# Altium footprint library vertigo.PcbLib: 115 footprints (part 6 of 8)
Each footprint in its own frame and in the unit in brackets; x right, y up, seen from the top. Pads: shape width x height; smd on the part's side, far side on the other; paste and mask are expansions set on the pad; w line width, h text height; cw(c..) or ccw(c..) is an arc to the next point about the centre after c.
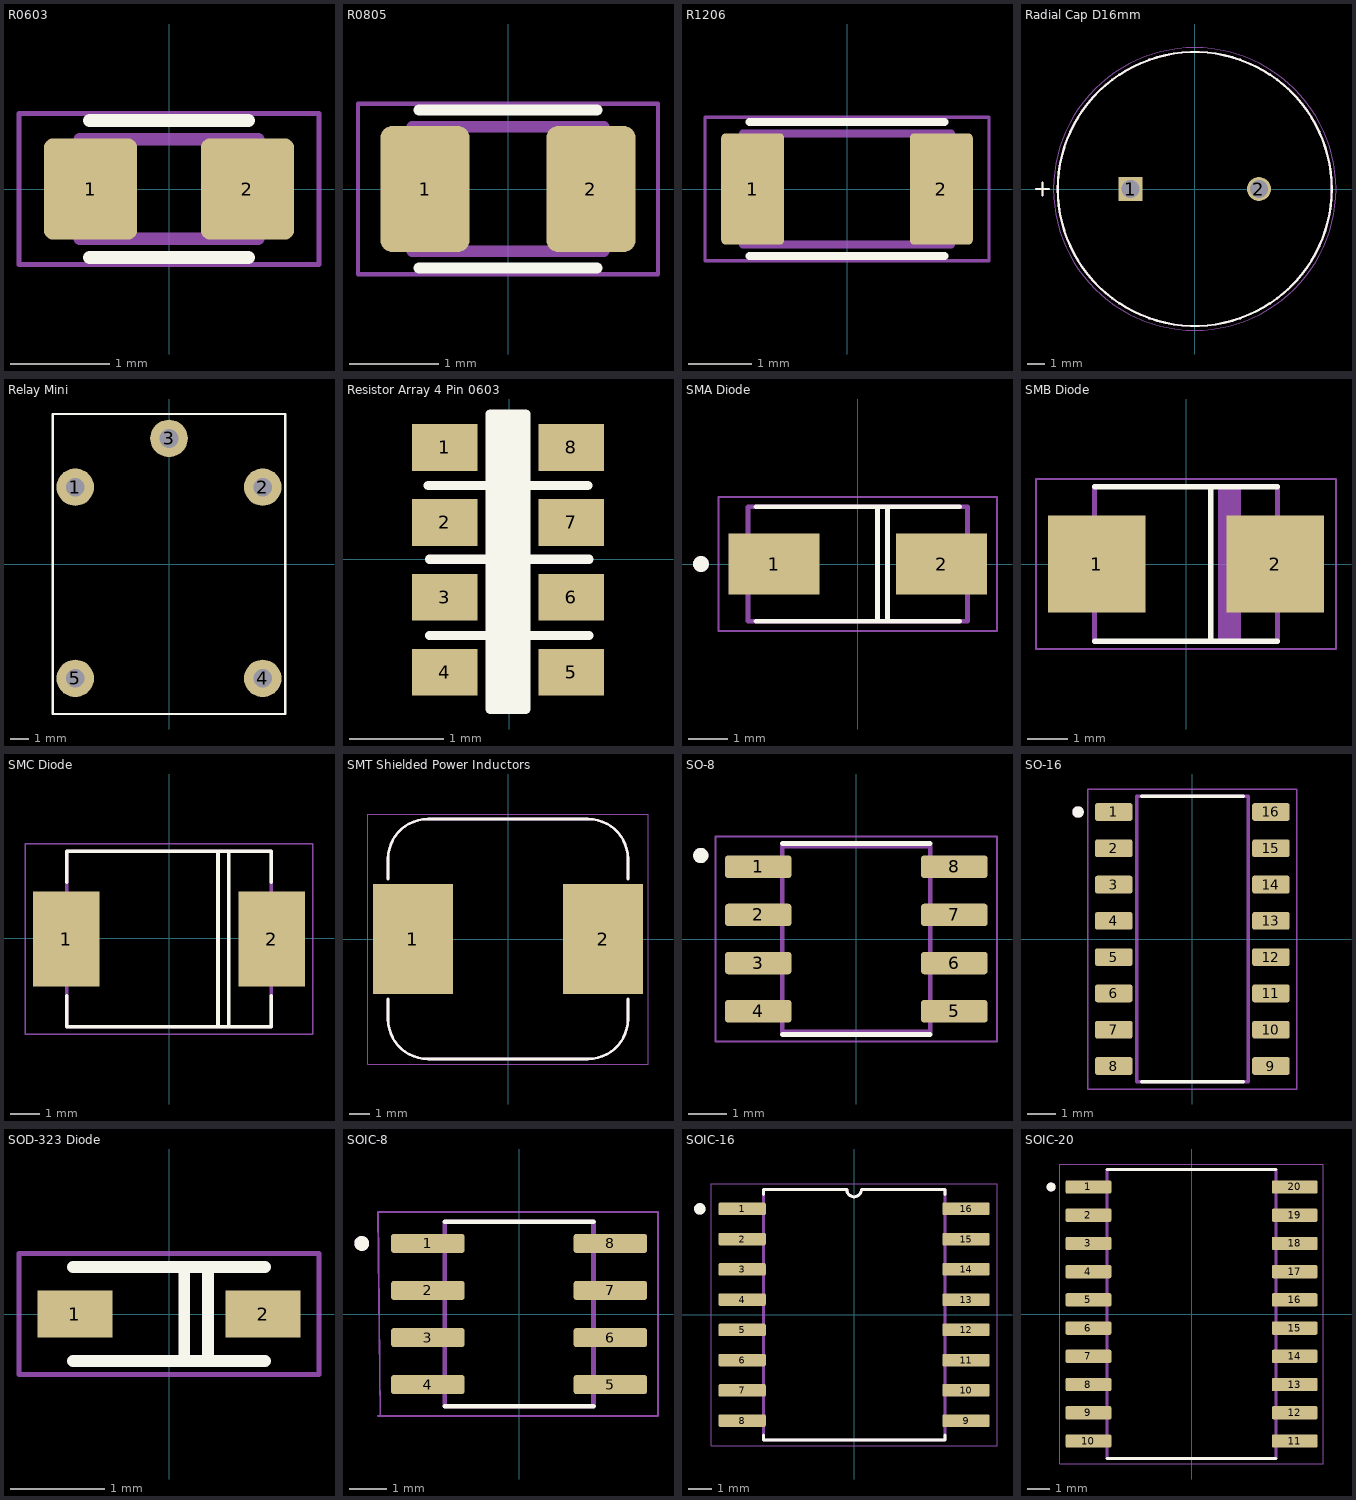
[diagram p5: the footprints below, top view; thin cyan lines are the x and y axes]

## R0603 [mm] "0603 SMD Package"
pads (2):
  rrect20% 0.94x1.02 smd: 1(-0.79,0) 2(0.79,0)
Top Overlay:
  lines w0.127: -0.8,-0.69 0.8,-0.69 ; -0.8,0.69 0.8,0.69
Mechanical 13:
  lines w0.127: -0.9,-0.5 0.9,-0.5 0.9,0.5 -0.9,0.5 -0.9,-0.5
Mechanical 15:
  lines w0.05: -1.51,-0.76 1.51,-0.76 1.51,0.76 -1.51,0.76 -1.51,-0.76
3D body "ERJU03J511V.STEP": height 0.45, standoff 0, extent -0.8,-0.4 0.8,0.4

## R0805 [mm] "0805 SMD Package"
pads (2):
  rrect25% 1x1.42 smd: 1(-0.935,0) 2(0.935,0)
Top Overlay:
  lines w0.127: -1,-0.89 1,-0.89 ; -1,0.89 1,0.89
Mechanical 13:
  lines w0.127: -1.08,-0.7 -1.08,0.7 1.08,0.7 1.08,-0.7 -1.08,-0.7
Mechanical 15:
  lines w0.05: -1.69,-0.96 -1.69,0.96 1.69,0.96 1.69,-0.96 -1.69,-0.96
3D body "4-1879028-2.STEP": height 0.6, standoff 0, extent -1,-0.625 1,0.625

## R1206 [mm] "Resistor 1206 Package"
pads (2):
  rrect14% 1x1.77 smd: 1(-1.5,0) 2(1.5,0)
Top Overlay:
  lines w0.127: -1.55,-1.065 1.55,-1.065 ; -1.55,1.065 1.55,1.065
Mechanical 13:
  lines w0.127: -1.65,-0.88 -1.65,0.88 1.65,0.88 1.65,-0.88 -1.65,-0.88
Mechanical 15:
  lines w0.05: -2.26,-1.14 -2.26,1.14 2.26,1.14 2.26,-1.14 -2.26,-1.14
3D body "R1206.STEP": height 0.55, standoff 0, extent -1.55,-0.775 1.55,0.775

## Radial Cap D16mm [mm] "Radial Package Diameter 16mm"
pads (2):
  rect 1.4x1.4 hole 1.05: 1(-3.75,0)
  round 1.4 hole 1.05: 2(3.75,0)
Top Overlay:
  circle w0.127: c0,0 r8
  lines w0.127: -9.271,0 -8.509,0 ; -8.89,-0.381 -8.89,0.381
Mechanical 13:
  circle w0.127: c0,0 r8
  lines w0.127: -9.271,0 -8.509,0 ; -8.89,-0.381 -8.89,0.381
Mechanical 15:
  circle w0.05: c0,0 r8.25
3D body "step_temp.STEP": height 25, standoff -17, extent -8,-7.997 8,7.997

## Relay Mini [mm]
pads (5):
  round 2 hole 1: 1(-5,4.1) 2(5,4.1) 3(0,6.7) 4(5,-6.1) 5(-5,-6.1)
Top Overlay:
  lines w0.127: -6.2,-8 6.2,-8 6.2,8 -6.2,8 -6.2,-8
3D body: height 14, standoff 0, extent -6.223,-8.001 6.223,8.001

## Resistor Array 4 Pin 0603 [mm]
pads (8):
  rect 0.7x0.5 smd: 1(-0.686,1.194) 2(-0.686,0.394) 3(-0.686,-0.406) 4(-0.686,-1.206) 5(0.66,-1.206) 6(0.66,-0.406) 7(0.66,0.394) 8(0.66,1.194)
Top Overlay:
  rectangle: -0.203,-1.651 0.178,1.549
  lines w0.099: -0.864,0.787 0.838,0.787 ; -0.851,-0.813 0.851,-0.813 ; -0.851,0 0.851,0 ; -0.203,-1.6 -0.203,1.549 0.178,1.549 0.178,-1.6 -0.203,-1.6
3D body "CAT16-x4.stp": height 0.6, standoff 0, extent -0.886,-1.675 0.864,1.675

## SMA Diode [mm] "DO214AC [SMA] Package"
pads (2):
  rect 2.33x1.55 smd: 1(-2.135,0) 2(2.135,0)
Top Overlay:
  circle w0.2: c-4,0 r0.1
  lines w0.127: -2.6,-1.46 2.6,-1.46 ; -2.6,1.46 2.6,1.46 ; 0.508,-1.397 0.508,1.397 ; 0.762,-1.397 0.762,1.397
Mechanical 13:
  circle w0.2: c-4,0 r0.1
  lines w0.127: 0.508,-1.397 0.508,1.397 ; 0.762,-1.397 0.762,1.397 ; -2.8,-1.46 2.8,-1.46 2.8,1.46 -2.8,1.46 -2.8,-1.46
Mechanical 15:
  lines w0.05: -3.55,-1.71 3.55,-1.71 3.55,1.71 -3.55,1.71 -3.55,-1.71
3D body "b340a-13-f.stp": height 2.18, standoff 0, extent -2.598,-1.335 2.598,1.27

## SMB Diode [mm] "DO214AA [SMB] Package"
pads (2):
  rect 2.4x2.4 smd: 1(-2.2,0) 2(2.2,0)
Top Overlay:
  lines w0.127: -2.261,-1.905 2.261,-1.905 ; -2.261,1.905 2.261,1.905 ; 0.609,-1.906 0.609,1.904
Mechanical 13:
  region: 0.8,1.9 1.35,1.9 1.35,-1.9 0.8,-1.9
  region: -2.794,1.092 -2.261,1.092 -2.261,-1.092 -2.794,-1.092
  region: 2.261,1.092 2.794,1.092 2.794,-1.092 2.261,-1.092
  lines w0.127: -2.261,-1.905 -2.261,1.905 ; 2.261,-1.905 2.261,1.905
Mechanical 15:
  lines w0.05: -3.7,-2.1 -3.7,2.1 3.7,2.1 3.7,-2.1 -3.7,-2.1
3D body "B340LB-13-F.STEP": height 2.5, standoff 0, extent -2.648,-1.81 2.648,1.81

## SMC Diode [mm] "DO214AB [SMC] Package"
pads (2):
  rect 2.25x3.18 smd: 1(-3.457,-0.033) 2(3.453,-0.033)
Top Overlay:
  lines w0.127: -3.44,-1.943 -3.44,-2.983 3.435,-2.983 3.435,-1.943 ; -3.44,1.877 -3.44,2.917 3.435,2.917 3.435,1.877 ; 1.649,-2.945 1.649,2.888 ; 2.009,-2.945 2.009,2.888
Mechanical 13:
  lines w0.127: -3.44,-2.983 -3.44,2.917 3.435,2.917 3.435,-2.983 -3.44,-2.983
Mechanical 15:
  lines w0.05: -4.832,-3.233 -4.832,3.167 4.828,3.167 4.828,-3.233 -4.832,-3.233
3D body "SS34.STEP": height 2.5, standoff 0, extent -3.95,-2.9 3.95,2.9

## SMT Shielded Power Inductors [mm] "SMT"
pads (2):
  rect 4x5.5 smd: 1(-4.75,0) 2(4.75,0)
Top Overlay:
  lines w0.127: -6,-3 -6,-4 ccw(c-4,-4) -4,-6 4,-6 ccw(c4,-4) 6,-4 6,-3 ; -6,3 -6,4 cw(c-4,4) -4,6 4,6 cw(c4,4) 6,4 6,3
Mechanical 13:
  lines w0.127: -6,-3 -6,-4 ccw(c-4,-4) -4,-6 4,-6 ccw(c4,-4) 6,-4 6,-3 ; -6,3 -6,4 cw(c-4,4) -4,6 4,6 cw(c4,4) 6,4 6,3
Mechanical 15:
  lines w0.05: -7,-6.25 7,-6.25 7,6.25 -7,6.25 -7,-6.25
3D body "MSS1246-474KLB--3DModel-STEP-56544.STEP": height 4.8, standoff 0, extent -6,-6 6,6

## SO-8 [mm] "SO-8 Package"
pads (8):
  rrect25% 1.75x0.59 smd: 1(-2.585,1.905) 2(-2.585,0.635) 3(-2.585,-0.635) 4(-2.585,-1.905) 5(2.585,-1.905) 6(2.585,-0.635) 7(2.585,0.635) 8(2.585,1.905)
Top Overlay:
  circle w0.2: c-4.1,2.2 r0.1
  lines w0.127: -1.95,-2.52 1.95,-2.52 ; -1.95,2.52 1.95,2.52
Mechanical 13:
  circle w0.2: c-4.1,2.2 r0.1
  lines w0.127: -1.95,-2.45 1.95,-2.45 1.95,2.45 -1.95,2.45 -1.95,-2.45
Mechanical 15:
  lines w0.05: -3.71,-2.7 3.71,-2.7 3.71,2.7 -3.71,2.7 -3.71,-2.7
3D body "step_temp.STEP": height 1.75, standoff 0, extent -3,-2.45 3,2.45

## SO-16 [mm] "SO-16 Package"
pads (16):
  rrect25% 1.31x0.62 smd: 1(-2.75,4.445) 2(-2.75,3.175) 3(-2.75,1.905) 4(-2.75,0.635) 5(-2.75,-0.635) 6(-2.75,-1.905) 7(-2.75,-3.175) 8(-2.75,-4.445) 9(2.75,-4.445) 10(2.75,-3.175) 11(2.75,-1.905) 12(2.75,-0.635) 13(2.75,0.635) 14(2.75,1.905) 15(2.75,3.175) 16(2.75,4.445)
Top Overlay:
  circle w0.2: c-4,4.445 r0.1
  lines w0.127: -1.775,-5 1.775,-5 ; -1.775,5 1.775,5
Mechanical 13:
  circle w0.2: c-4,4.445 r0.1
  lines w0.127: -1.95,-5 -1.95,5 1.95,5 1.95,-5 -1.95,-5
Mechanical 15:
  lines w0.05: -3.655,-5.25 -3.655,5.25 3.655,5.25 3.655,-5.25 -3.655,-5.25
3D body "step_temp.STEP": height 1.8, standoff 0, extent -3,-5 3,5

## SOD-323 Diode [mm] "SOD-323 Package"
pads (2):
  rect 0.8x0.5 smd: 1(-1,0) 2(1,0)
Top Overlay:
  lines w0.127: -1.022,-0.502 1.022,-0.502 ; -1.022,0.502 1.022,0.502 ; 0.162,-0.489 0.162,0.489 ; 0.416,-0.489 0.416,0.489
Mechanical 15:
  lines w0.05: -1.594,-0.643 1.594,-0.643 1.594,0.643 -1.594,0.643 -1.594,-0.643
3D body "step_temp.STEP": height 1.15, standoff 0, extent -1.338,-0.65 1.338,0.65

## SOIC-8 [mil] "SOIC-8 Package"
pads (8):
  rrect25% 78x20 smd: 1(-97,75) 2(-97,25) 3(-97,-25) 4(-97,-75) 5(97,-75) 6(97,-25) 7(97,25) 8(97,75)
Top Overlay:
  circle w7.87: c-167.32,75 r3.94
  lines w5: -79,-98 79,-98 ; -79,98 79,98
Mechanical 13:
  circle w7.87: c-167.32,75 r3.94
  lines w5: -79,-98 79,-98 79,98 -79,98 -79,-98
Mechanical 15:
  lines w1.97: -150,-108.27 147.64,-108.27 147.64,108.27 -150,108.27 -147.64,-108.27
3D body "IR2104SPBF.STEP": height 68.9, standoff 0, extent -118.11,-98.43 118.11,98.43

## SOIC-16 [mil] "SOIC-16 Package"
pads (16):
  rrect25% 78x21 smd: 1(-185,175) 2(-185,125) 3(-185,75) 4(-185,25) 5(-185,-25) 6(-185,-75) 7(-185,-125) 8(-185,-175) 9(185,-175) 10(185,-125) 11(185,-75) 12(185,-25) 13(185,25) 14(185,75) 15(185,125) 16(185,175)
Top Overlay:
  circle w9.45: c-255,175 r4.72
  lines w5: -150,-199 -150,-207 150,-207 150,-199 ; -150,199 -150,207 -12,207 ccw(c0,207) 12,207 150,207 150,199
Mechanical 13:
  circle w9.45: c-255,175 r4.72
  lines w5: -150,-207 150,-207 150,207 12,207 cw(c0,207) -12,207 -150,207 -150,-207
Mechanical 15:
  lines w1.97: -236.22,-216.54 236.22,-216.54 236.22,216.54 -236.22,216.54 -236.22,-216.54
3D body "R05C05TE05S-CT.STEP": height 104.33, standoff 0, extent -202.76,-203.74 202.76,203.74

## SOIC-20 [mm] "SOIC-20 Package"
pads (20):
  rrect25% 2.06x0.6 smd: 1(-4.64,5.715) 2(-4.64,4.445) 3(-4.64,3.175) 4(-4.64,1.905) 5(-4.64,0.635) 6(-4.64,-0.635) 7(-4.64,-1.905) 8(-4.64,-3.175) 9(-4.64,-4.445) 10(-4.64,-5.715) 11(4.64,-5.715) 12(4.64,-4.445) 13(4.64,-3.175) 14(4.64,-1.905) 15(4.64,-0.635) 16(4.64,0.635) 17(4.64,1.905) 18(4.64,3.175) 19(4.64,4.445) 20(4.64,5.715)
Top Overlay:
  circle w0.2: c-6.319,5.715 r0.1
  lines w0.127: -3.8,-6.5 3.8,-6.5 ; -3.8,6.5 3.8,6.5
Mechanical 13:
  circle w0.2: c-6.319,5.715 r0.1
  lines w0.127: -3.8,-6.5 -3.8,6.5 3.8,6.5 3.8,-6.5 -3.8,-6.5
Mechanical 15:
  lines w0.05: -5.92,-6.75 -5.92,6.75 5.92,6.75 5.92,-6.75 -5.92,-6.75
3D body "SN74LVC244ADWR.STEP": height 2.65, standoff 0, extent -5.15,-6.4 5.15,6.4